# Altium schematic symbol library lib_datalogger.SchLib: 1246 symbols (part 8 of 16) (continued)
## CMP-010-00001-3 (continued)

## CMP-010-000002-1
designator F?, comment FUSE GLASS 3A 250VAC 5X20MM
Manufacturer Part Number: 5MF 3-R; Manufacturer: Bel Fuse Inc.; DC Cold Resistance: 0.03 Ohm; Response Time: Fast; Melting I²t: 13; Voltage Rating - AC: 250V; Approvals: CE, CSA, cULus, PSE; Fuse Type: Cartridge, Glass; Breaking Capacity @ Rated Voltage: 200A; Design Item ID: FUSE GLASS 3A 250VAC 5X20MM; Stock 1: 10338; Pricing 1: 1=0.21, 5=0.204, 10=0.195, 50=0.1736, 100=0.1616, 250=0.14364, 500=0.1197, 1000=0.11372, 5000=0.08978 (USD); RoHS: RoHS Compliant; Color: -; ComponentLink1URL: http://belfuse.com/pdfs/5MF.pdf; Source: mits.SchLib; Voltage Rating - DC: -; Part Status: Active; Category: Circuit Protection; Current Rating: 3A; Size / Dimension: 0.201" Dia x 0.787" L (5.10mm x 20.00mm); Packaging: Bulk; Package / Case: 5mm x 20mm; Operating Temperature: -55°C ~ 125°C; ComponentLink1Description: http://belfuse.com/pdfs/5MF.pdf; Mounting Type: Holder
footprint FUSE_1/4_37.75x6.35mm
footprint FUSE

## CMP-010-00002-3
designator U?, comment MCP9700T-E/TT
Low-Power Linear Active Thermistor(TM) IC, 2.3 to 5.5 V, -40 to 125degC, 3-Pin SOT-23, RoHS, Tape and Reel; Manufacturer: Microchip; Min Supply Voltage (DC): 3V; Max Supply Voltage (DC): 5V; Max Ouput Current: 100A; Sensor Type: Temperature; Interface: Serial; Output Voltage: 500mV; Min Supply Voltage: 2.3V; Output Current: 100µA; Mounting Technology: SM; Datasheet URL: http://ww1.microchip.com/downloads/en/DeviceDoc/21942e.pdf; Package Reference: SOT23-3; Max Supply Voltage: 5V; Package Description: 3-Pin Small Outline Transistor, Body 2.9 x 1.3 mm, Pitch 0.95 mm; Packaging: TapeandReel; Case/Package: TO-236-3; Pins: 3; Max Operating Temperature: 125°C; Min Operating Temperature: -40°C; Package Quantity: 3000; RoHS Compliant: True; Datasheet Version: Rev. E, 04/2009
footprint MCHP-SOT23-3_L (SOT23, 3-Leads, Body 3.05x1.4mm, Pitch 0.95mm, IPC High Density)
footprint MCHP-SOT23-3_M (SOT23, 3-Leads, Body 3.05x1.4mm, Pitch 0.95mm, IPC Low Density)
pins: 1 VDD (power), 2 VOUT (power), 3 GND (power)

## CMP-010-000003-1
designator F?, comment FUSE CERM 10A 250VAC 125VDC 3AB
Manufacturer Part Number: BK/ABC-10-R; Manufacturer: Eaton; Response Time: Fast; Melting I²t: 208.8; Voltage Rating - DC: 125V; Voltage Rating - AC: 250V; DC Cold Resistance: 0.011 Ohm; Fuse Type: Cartridge, Ceramic; Breaking Capacity @ Rated Voltage: 200A AC, 10kA DC; Approvals: CSA, UL; Stock 1: 5849; Package / Case: 3AB, 3AG, 1/4" x 1-1/4"; Category: Circuit Protection; Color: -; Design Item ID: FUSE CERM 10A 250VAC 125VDC 3AB; Mounting Type: Holder; Packaging: Bulk; Source: mits.SchLib; Pricing 1: 1=0.92, 5=0.886, 10=0.829, 50=0.6864, 100=0.572, 250=0.55772, 500=0.4719, 1000=0.4147, 5000=0.3718 (USD); Operating Temperature: -; Size / Dimension: 0.250" Dia x 1.250" L (6.35mm x 31.75mm); Part Status: Active; Current Rating: 10A; ComponentLink1URL: http://www.cooperindustries.com/content/dam/public/bussmann/Electronics/Resources/product-datasheets/Bus_Elx_DS_2000_ABC_Series.pdf; ComponentLink1Description: http://www.cooperindustries.com/content/dam/public/bussmann/Electronics/Resources/product-datasheets/Bus_Elx_DS_2000_ABC_Series.pdf; RoHS: RoHS Compliant
footprint FUSE_1/4_37.75x6.35mm
footprint FUSE_1%2F4_37.75x6.35mm

## CMP-010-00003-3
designator U?, comment MCP9808-E/MS
+/- 0.5 degC Maximum Accuracy Digital Temperature Sensor, 2.7 to 5.5 V, -40 to 125 degC, 8-Pin MSOP, Pb-Free, Tube; Manufacturer: Microchip; Min Supply Voltage (DC): 7V; Min Supply Voltage: 2.7V; Max Supply Voltage (DC): 5V; Output Current: 200µA; Interface: I2C; Case/Package: MSOP; Pins: 8; Max Operating Temperature: 125°C; Datasheet URL: http://ww1.microchip.com/downloads/en/DeviceDoc/25095A.pdf; Packaging: Tray; Package Reference: MSOP-MS8; Package Description: 8-Pin Plastic Micro Small Outline Package, Body 3 x 3 mm, Pitch 0.65 mm; Mounting Technology: SM; RoHS Compliant: True; Package Quantity: 100; Min Operating Temperature: -40°C; Sensor Type: Temperature; Max Supply Voltage: 5V; Datasheet Version: Rev. A, 10/2011
footprint MCHP-MSOP-MS8_L (SOP, 8-Leads, Body 3x3mm, Pitch 0.65mm, IPC High Density)
footprint MCHP-MSOP-MS8_N (SOP, 8-Leads, Body 3x3mm, Pitch 0.65mm, IPC Medium Density)
footprint MCHP-MSOP-MS8_M (SOP, 8-Leads, Body 3x3mm, Pitch 0.65mm, IPC Low Density)
pins: 1 SDA (io) "Serial Data Line", 2 SCL (in) "Serial Clock Line", 3 ALERT (oc) "Temperature Alert Output", 4 GND (power) "Ground", 5 A2 (in) "Slave Address", 6 A1 (in) "Slave Address", 7 A0 (in) "Slave Address", 8 VDD (power) "Power Pin"

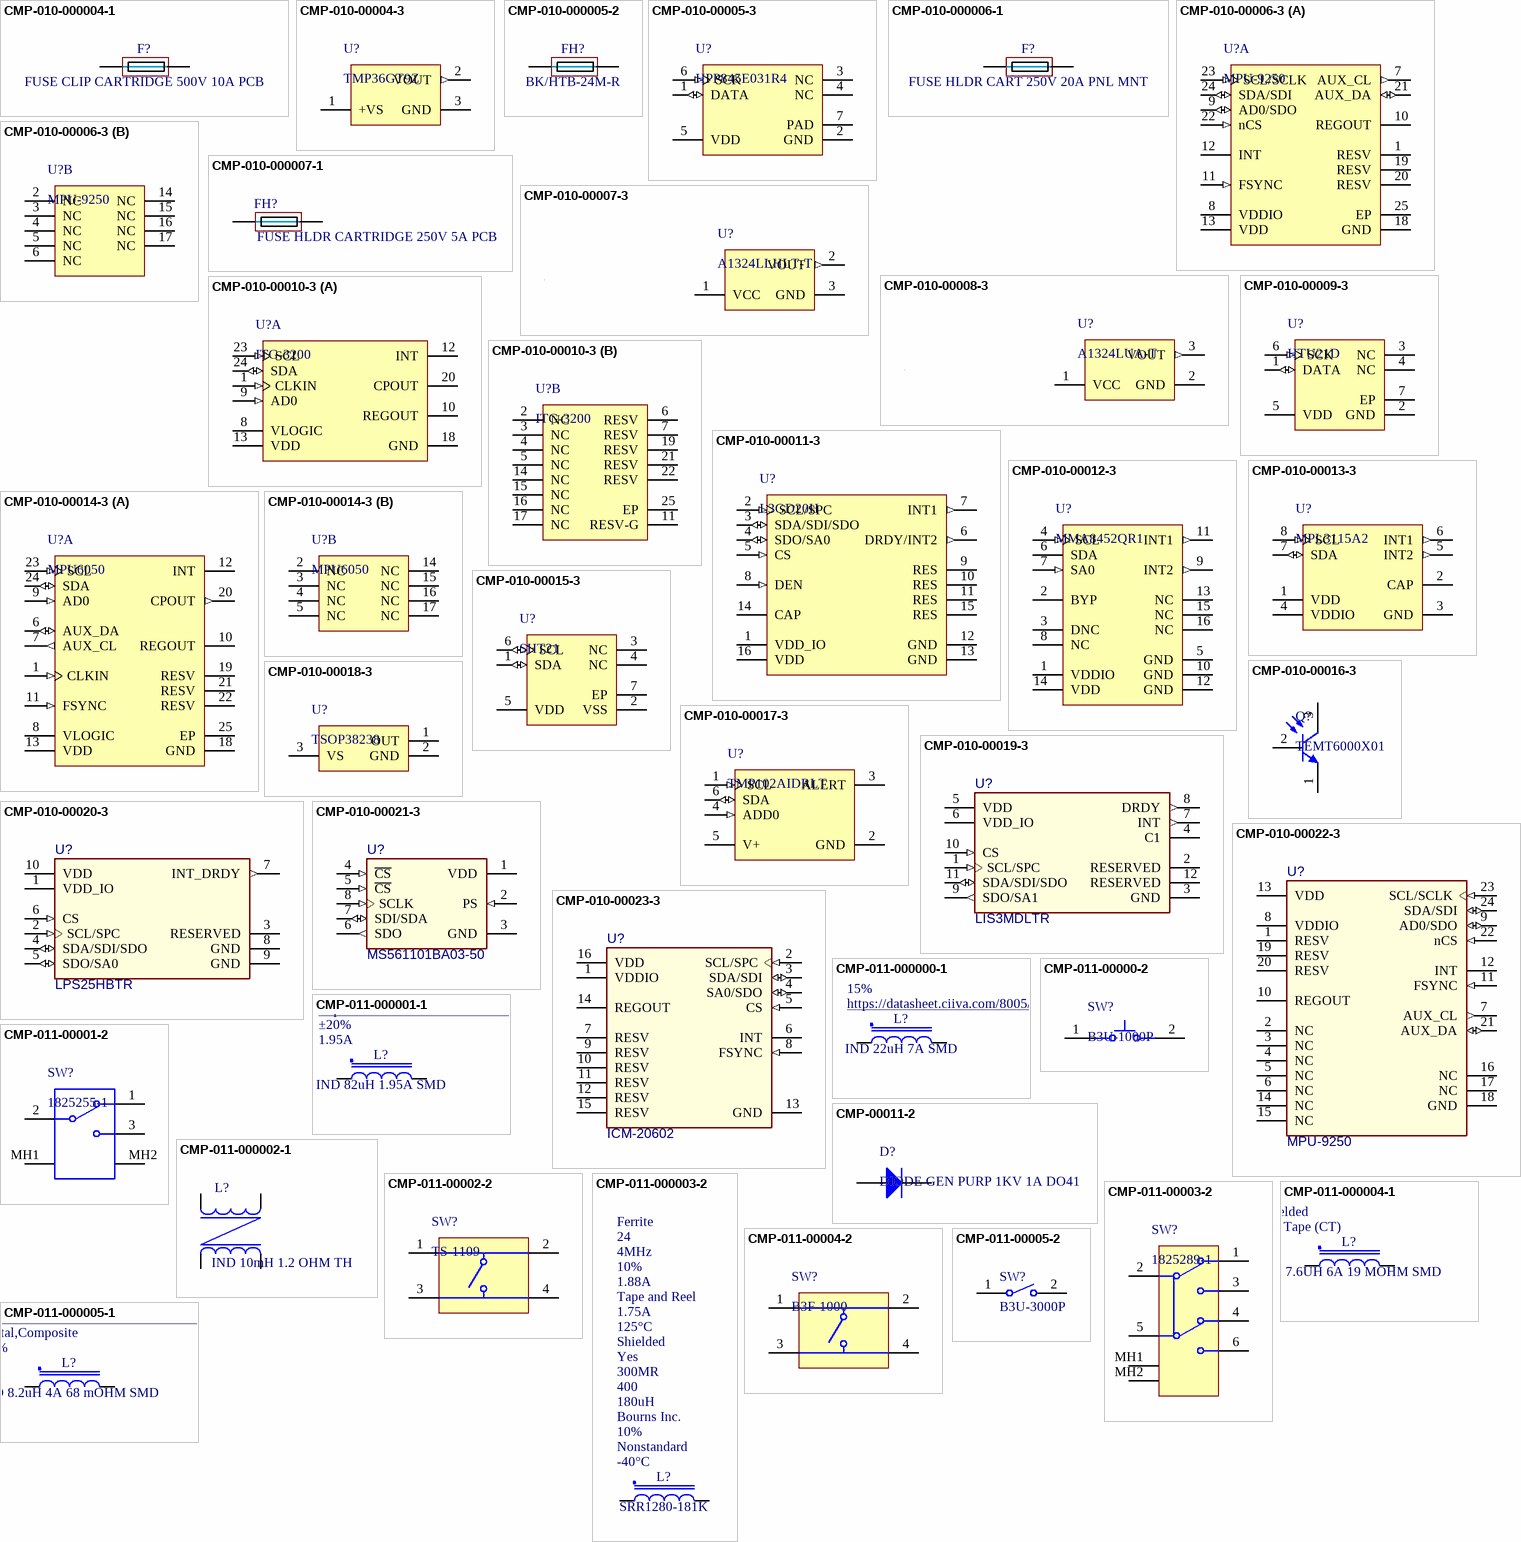
[diagram p22: symbols CMP-010-000004-1 to CMP-011-00005-2]

## CMP-010-000004-1
designator F?, comment FUSE CLIP CARTRIDGE 500V 10A PCB
Manufacturer: Littelfuse Inc.; Manufacturer Part Number: 10207101009; Number of Circuits: 1; For Use With/Related Products: 1/4" Dia; Fuse Size: 1/4" Dia (6.35mm); Contact Material: Brass; Pricing 1: 1=0.24, 10=0.221, 25=0.204, 50=0.1972, 100=0.1836, 250=0.1632, 500=0.136, 1000=0.1292, 2500=0.1156 (USD); RoHS: RoHS Compliant; Stock 1: 48459; Current Rating: 10A; Fuseholder Type: Clip; Contact Finish: Tin; Part Status: Active; Mounting Type: PCB; Orientation: Horizontal; Source: mits.SchLib; ComponentLink1URL: http://www.littelfuse.com/~/media/electronics/datasheets/fuse_clips/littelfuse_fuse_clip_520_521_102071_datasheet.pdf.pdf; Category: Circuit Protection; Termination Style: PC Pin; Design Item ID: FUSE CLIP CARTRIDGE 500V 10A PCB; Voltage: 500V; ComponentLink1Description: http://www.littelfuse.com/~/media/electronics/datasheets/fuse_clips/littelfuse_fuse_clip_520_521_102071_datasheet.pdf.pdf; Fuse Type: Cartridge
footprint FUSE_CLIPS
footprint FUSE_CLIPS
pins: 1, 2

## CMP-010-00004-3
designator U?, comment TMP36GT9Z
Low Voltage Temperature Sensor, 2.7 to 5.5 V, -55 to 150 degC, 3-pin TO-92 (T-3), Tray; Manufacturer: Analog Devices; Nominal Supply Voltage: 3.3V; Interface: Serial; Package Version: 042208-A, 04/2008; Max Supply Voltage: 5.5V; Min Supply Voltage: 2.7V; Datasheet Version: Rev. H, 05/2015; Mounting Technology: TH; RoHS Compliant: True; Package Reference: T-3; Min Operating Temperature: -40°C; Package Description: 3-Pin Plastic Header-Style Package [TO-92]; Sensor Type: Temperature; Packaging: Tray; Max Operating Temperature: 150°C; Package Quantity: 100; Pins: 3; Case/Package: TO-226-3; Datasheet URL: http://www.analog.com/static/imported-files/data_sheets/TMP35_36_37.pdf
footprint ADI-T-3 (TO, 3-Leads, Dia 5.2mm)
pins: 1 +VS (power), 2 VOUT (out), 3 GND (power)

## CMP-010-000005-2
designator FH?, comment BK/HTB-24M-R
Fuse Holder 16A 250V Panel Mount Quick Connect Bulk; Manufacturer: Eaton Bussmann; Fuse Size: 5mm x 20mm; Number of Circuits: 1; Fuse Current: 15A; Body Material: Thermoplastic; Illumination Type: Illuminated; MSRP: 1,313; eVendor#: 283-2712-ND; Obs: Utilizar fusível do tamanho 5x20mm; eVendorPrice: 3,03; eVendor: Digi-Key; Series: HTB; Contact Plating: Tin; Mount: Panel; Length: 41.1mm; Current Rating: 16A; Min Operating Temperature: -55°C; Number of Poles: 1; Termination: Quick Connect; Radiation Hardening: No; Datasheet: http://www.cooperindustries.com/content/dam/public/bussmann/Electronics/Resources/product-datasheets/Bus_Elx_DS_2119_HTB_Series.pdf; Voltage: 250V; Part#: BK/HTB-24M-R; REACH SVHC: No SVHC; Weight: 0.304oz; Material: Thermoplastic; Voltage Rating: 250V; Package Quantity: 100; Number of Pins: 2; Flammability Rating: UL94 V-0; MOQ: 2500; Max Operating Temperature: 85°C; Contact Material: Brass; Packaging: Bulk; Source: mits.SchLib; Color: Black; Lead Free: Lead Free; Voltage Rating (AC): 250V; Design Item ID: FUSE HLDR CART 250V 16A PNL MNT 5X20MM
footprint FUSE_HOLES
footprint FUSE_HOLES
pins: 1, 2

## CMP-010-00005-3
designator U?, comment HPP845E031R4
Digital Relative Humidity Sensor with Temperature Output, 1.5 to 3.6 V, -40 to 125 degC, 6-Pin SON, RoHS, Tape and Reel; Manufacturer: TE Connectivity; Max Supply Voltage: 3.6V; Min Supply Voltage: 1.5V; RoHS Compliant: False; Datasheet Version: Sep-15; Package Description: 6-Pin Small Outline No-lead Package, Body 3 x 3 mm, Pitch 1 mm; Datasheet URL: http://www.te.com/commerce/DocumentDelivery/DDEController?Action=srchrtrv&DocNm=HPC199_6&DocType=Data+Sheet&DocLang=English; Case/Package: SON-6; Package Reference: SON-6; Sensor Type: Humidity; Mounting Technology: SM
footprint TECO-SON-6_V (SON, 6-Leads, Body 3x3mm, Pitch 1mm, Thermal Pad 2.4x1.5mm)
pins: 1 DATA (io) "Data bit-stream", 2 GND (power) "Ground", 3 NC "Must be left unconnected", 4 NC "Must be left unconnected", 5 VDD (power) "Supply Voltage", 6 SCK (in) "Selector for RH or Temp", 7 PAD (power) "Ground or unconnected"

## CMP-010-000006-1
designator F?, comment FUSE HLDR CART 250V 20A PNL MNT
Manufacturer: Cooper Bussmann; Part#: BK/HTB-24I-R; Obs: Utilizar fusível do tamanho 5x20mm; MSRP: 1,27575; eVendor: Digi-Key; eVendorPrice: 2,98; eVendor#: 283-2711-ND; Datasheet: http://www.cooperindustries.com/content/dam/public/bussmann/Electronics/Resources/product-datasheets/Bus_Elx_DS_2119_HTB_Series.pdf; Source: mits.SchLib; MOQ: 2500; Design Item ID: FUSE HLDR CART 250V 20A PNL MNT
footprint FUSE_HOLES
footprint FUSE_HOLES
pins: 1, 2

## CMP-010-00006-3
designator U?, comment MPU-9250
9-axis MotionTracking device, 2.4 to 3,6 V, -40 to 85 degC, 24-Pin QFN, RoHS, Tape and Reel; Manufacturer: InvenSense; Sensor Type: Motion; Max Supply Voltage: 3.6V; Min Supply Voltage: 2.4V; Package Description: 24-Pin Quad Flat No-lead Package, Body 3 x 3 mm, Pitch 0.4 mm; RoHS Compliant: True; Datasheet Version: Rev. 1.0, 01/2014; Pins: 24; Mounting Technology: SM; Datasheet URL: http://datasheet.octopart.com/MPU-9250-InvenSense-datasheet-21859386.pdf; Package Quantity: 5000; Package Reference: QFN-24; Case/Package: Module
footprint INSE-QFN-24-1700X1540TP_L (QFN, 24-Leads, Body 3.1x3.1mm, Pitch 0.40mm, Thermal Pad 1.54x1.70mm, IPC High Density)
footprint INSE-QFN-24-1700X1540TP_N (QFN, 24-Leads, Body 3.1x3.1mm, Pitch 0.40mm, Thermal Pad 1.54x1.70mm, IPC Medium Density)
footprint INSE-QFN-24-1700X1540TP_M (QFN, 24-Leads, Body 3.1x3.1mm, Pitch 0.40mm, Thermal Pad 1.54x1.70mm, IPC Low Density)
part A pins: 1 RESV (power) "Reserved. Connect to VDDIO", 7 AUX_CL (out) "I2C Master serial clock, for connecting to external sensors", 8 VDDIO (power) "Digital I/O supply voltage", 9 AD0/SDO (io) "I2C Slave Address LSB (AD0); SPI serial data output (SDO)", 10 REGOUT "Regulator filter capacitor connection", 11 FSYNC (in) "Frame synchronization digital input. Connect to GND if unused", 12 INT (hiz) "Interrupt digital output (totem pole or open-drain)", 13 VDD (power) "Power supply voltage and Digital I/O supply voltage", 18 GND (power) "Pow er supply ground", 19 RESV "Reserved. Do not connect", 20 RESV (power) "Reserved. Connect to GND", 21 AUX_DA (io) "I2C master serial data, for connecting to external sensors", 22 nCS (in) "Chip select (SPI mode only)", 23 SCL/SCLK (in) "I2C serial clock (SCL); SPI serial clock (SCLK)", 24 SDA/SDI (io) "I2C serial data (SDA); SPI serial data input (SDI)", 25 EP
part B pins: 2 NC "Not internally connected. May be used for PCB trace routing", 3 NC "Not internally connected. May be used for PCB trace routing", 4 NC "Not internally connected. May be used for PCB trace routing", 5 NC "Not internally connected. May be used for PCB trace routing", 6 NC "Not internally connected. May be used for PCB trace routing", 14 NC "Not internally connected. May be used for PCB trace routing", 15 NC "Not internally connected. May be used for PCB trace routing", 16 NC "Not internally connected. May be used for PCB trace routing", 17 NC "Not internally connected. May be used for PCB trace routing"

## CMP-010-000007-1
designator FH?, comment FUSE HLDR CARTRIDGE 250V 5A PCB
Manufacturer Part Number: 4527; Manufacturer: Keystone Electronics; For Use With/Related Products: 1/4" Dia; Fuseholder Type: Holder; Number of Circuits: 1; Fuse Size: 5mm x 20mm; Pricing 1: 1=0.73, 10=0.55, 50=0.44, 100=0.4217, 250=0.38504, 500=0.3667, 1000=0.30784, 2500=0.27504, 5000=0.26586 (USD); ComponentLink1Description: http://www.keyelco.com/product-pdf.cfm?p=324; Category: Circuit Protection; Termination Style: PC Pin; Design Item ID: FUSE HLDR CARTRIDGE 250V 5A PCB; Mounting Type: PCB; Stock 1: 22541; Current Rating: 5A; RoHS: RoHS Compliant; Contact Material: Brass; Source: mits.SchLib; Fuse Type: Cartridge; ComponentLink1URL: http://www.keyelco.com/product-pdf.cfm?p=324; Part Status: Active; Orientation: Horizontal; Contact Finish: Tin; Voltage: 250V
footprint FUSE_HOLDER
footprint FUSE_HOLDER
pins: 1, 2

## CMP-010-00007-3
designator U?, comment A1324LLHLT-T
Low Noise, Linear Hall Effect Sensor IC with Analog Output, 4.5 to 5.5 V, -40 to 150 degC, 3-Pin SOT23, RoHS, Tape and Reel; Manufacturer: Allegro Microsystems; Nominal Supply Voltage: 5V; Max Supply Voltage: 5.5V; Min Supply Voltage: 4.5V; Package Quantity: 3000; Packaging: TapeandReel; Pins: 3; Case/Package: SOT23W-3; Min Operating Temperature: -40°C; Datasheet URL: http://www.allegromicro.com/en/Products/Part_Numbers/1324/1324.pdf; Max Operating Temperature: 150°C; Package Description: 3-Pin Small Outline Transistor, Body 3 x 1.975 mm, Pitch 0.95 mm; Datasheet Version: Rev. 4, 09/2013; Package Reference: SOT23W-3; Mounting Technology: SM; Sensor Type: Hall; RoHS Compliant: True
footprint ALEG-SOT23W-3_V (SOT23, 3-Leads, Body 3.1x2.1mm, Pitch 0.95mm)
pins: 1 VCC (power) "Input power supply; tie to GND with  bypass capacitor", 2 VOUT (out) "Output signal; also used for  programming", 3 GND (power) "Ground"

## CMP-010-00008-3
designator U?, comment A1324LUA-T
Low Noise, Linear Hall Effect Sensor IC with Analog Output, 4.5 to 5.5 V, -40 to 150 degC, 3-Pin SIP (UA), RoHS, Bulk; Manufacturer: Allegro Microsystems; Max Supply Voltage: 5.5V; Output Current: 10mA; Nominal Supply Voltage: 5V; Min Supply Voltage: 4.5V; Package Description: 3-Pin Single In-line Package, Body 4.105 x 1.52 mm, Pitch 1.27 mm; Mounting Technology: TH; Package Reference: UA3; Case/Package: SIP; RoHS Compliant: True; Datasheet Version: Rev. 4, 09/2013; Max Operating Temperature: 150°C; Package Quantity: 4000; Datasheet URL: http://www.allegromicro.com/en/Products/Part_Numbers/1324/1324.pdf; Sensor Type: Hall; Pins: 3; Min Operating Temperature: -40°C; Packaging: Bulk
footprint ALEG-UA-3 (SIP, 3-Leads, Body 4.2x1.6mm, Pitch 1.27 mm)
pins: 1 VCC (power) "Input power supply; tie to GND with  bypass capacitor", 2 GND (power) "Ground", 3 VOUT (out) "Output signal; also used for  programming"

## CMP-010-00009-3
designator U?, comment HTU21D
Digital Relative Humidity Sensor with Temperature Output, 1.5 to 3.6 V, -40 to 125 degC, 6-Pin SON, RoHS, Tape and Reel; Manufacturer: Measurement Specialties; Min Supply Voltage: 1.5V; Interface: Serial; Max Supply Voltage: 3.6V; Nominal Supply Voltage: 3V; Max Operating Temperature: 125°C; Case/Package: DFN; RoHS Compliant: True; Pins: 6; Sensor Type: Humidity; Package Description: 6-Pin Small Outline No-Lead, Body 3 x 3 mm, Pitch 1 mm, Thermal Pad 2.4 x 1.5 mm; Min Operating Temperature: -40°C; Mounting Technology: SM; Datasheet URL: https://datasheet.ciiva.com/28624/1792510-28624306.pdf; Package Reference: SON-6; Packaging: TapeandReel; Datasheet Version: Rev. 2, 07/2013
footprint MEAS-SON-6_V (SON, 6-Leads, Body 3x3mm, Pitch 1mm, Thermal Pad 2.4x1.5mm)
pins: 1 DATA (io) "Data bit-stream", 2 GND (power) "Ground", 3 NC "Must be left unconnected", 4 NC "Must be left unconnected", 5 VDD (power) "Supply Voltage", 6 SCK (in) "Selector for RH or Temp", 7 EP (power) "Ground or unconnected"

## CMP-010-00010-3
designator U?, comment ITG-3200
Single-Chip, Digital-Output, MEMS Gyroscope, 2.1 to 3.6 V, -40 to 105 degC, 24 -Pin QFN, RoHS, Tape and Reel; Manufacturer: InvenSense; Interface: Serial; Min Supply Voltage: 2.1V; Max Supply Voltage: 3.6V; Min Operating Temperature: -40°C; Datasheet URL: http://www.farnell.com/datasheets/887152.pdf; Datasheet Version: Rev. 1.4, 03/2010; Packaging: CutTape; Pins: 24; Package Description: 24-Pin Quad Flat No-lead Package, Body 4.00 x 4.00 mm, Pitch 0.50 mm, Thermal Pad 3.00 x 2.80 mm; RoHS Compliant: True; Max Operating Temperature: 85°C; Package Reference: QFN-24_A; Case/Package: QFN; Mounting Technology: SM
footprint INSE-QFN-24_A_L (QFN, 24-Leads, Body 4.1x4.1mm, Pitch 0.50mm, Thermal Pad 3.00x2.80mm, IPC High Density)
footprint INSE-QFN-24_A_N (QFN, 24-Leads, Body 4.1x4.1mm, Pitch 0.50mm, Thermal Pad 3.00x2.80mm, IPC Medium Density)
footprint INSE-QFN-24_A_M (QFN, 24-Leads, Body 4.1x4.1mm, Pitch 0.50mm, Thermal Pad 3.00x2.80mm, IPC Low Density)
part A pins: 1 CLKIN (in) "Optional external reference clock input. Connect to GND if unused.", 8 VLOGIC (power) "Digital IO supply voltage. VLOGIC must be =< VDD at all times.", 9 AD0 (in) "I2C Slave Address LSB", 10 REGOUT "Regulator filter capacitor connection", 12 INT (oc) "Interrupt digital output (totem pole or open-drain)", 13 VDD (power) "Power supply voltage", 18 GND (power) "Power supply ground", 20 CPOUT "Charge pump capacitor connection", 23 SCL (in) "I2C serial clock", 24 SDA (io) "I2C serial data"
part B pins: 2 NC "Not internally connected. May be used for PCB trace routing.", 3 NC "Not internally connected. May be used for PCB trace routing.", 4 NC "Not internally connected. May be used for PCB trace routing.", 5 NC "Not internally connected. May be used for PCB trace routing.", 6 RESV "Reserved. Do not connect.", 7 RESV "Reserved. Do not connect.", 11 RESV-G "Reserved - Connect to ground", 14 NC "Not internally connected. May be used for PCB trace routing.", 15 NC "Not internally connected. May be used for PCB trace routing.", 16 NC "Not internally connected. May be used for PCB trace routing.", 17 NC "Not internally connected. May be used for PCB trace routing.", 19 RESV "Reserved. Do not connect.", 21 RESV "Reserved. Do not connect.", 22 RESV "Reserved. Do not connect.", 25 EP

## CMP-010-00011-3
designator U?, comment L3GD20H
MEMS Motion Sensor: Three-Axis Digital Output Gyroscope, 2.2 to 3.6 V, -40 to 85 degC, 16-Pin LGA, RoHS, Tray; Manufacturer: STMicroelectronics; Max Supply Voltage: 3.6V; Min Supply Voltage: 2.2V; Pins: 16; Datasheet Version: Rev. 2, 03/2013; Package Description: 16-Pin Land Grid Array Package, Body 3 x 3 mm, Pitch 0.5 mm; RoHS Compliant: True; Case/Package: LGA; Packaging: CutTape; Datasheet URL: http://www.st.com/content/ccc/resource/technical/document/datasheet/35/b1/e0/39/71/57/43/01/DM00060659.pdf/files/DM00060659.pdf/jcr:content/translations/en.DM00060659.pdf; Sensor Type: Motion; Mounting Technology: SM; Package Reference: LGA-16
footprint STM-LGA-16_L (LGA, 16-Leads, Body 3.15x3.15mm, Pitch 0.5mm, IPC High Density)
footprint STM-LGA-16_N (LGA, 16-Leads, Body 3.15x3.15mm, Pitch 0.5mm, IPC Medium Density)
footprint STM-LGA-16_M (LGA, 16-Leads, Body 3.15x3.15mm, Pitch 0.5mm, IPC Low Density)
pins: 1 VDD_IO (power) "Power supply for I/O pins", 2 SCL/SPC (in), 3 SDA/SDI/SDO (io), 4 SDO/SA0 (io), 5 CS (in) "I2C/SPI mode selection (1: SPI idle mode / I2C communication enabled; 0: SPI communication mode / I2C disabled)", 6 DRDY/INT2 (out), 7 INT1 (out) "Programmable interrupt", 8 DEN (in) "Gyroscope data enable", 9 RES "Connect to GND", 10 RES "Connect to GND", 11 RES "Connect to GND or VDD", 12 GND (power) "0 V supply", 13 GND (power) "0 V supply", 14 CAP "Connect to GND with ceramic capacitor", 15 RES "Connect to GND or VDD", 16 VDD (power) "Power supply"

## CMP-010-00012-3
designator U?, comment MMA8452QR1
3-Axis, 12-Bit / 8-Bit Digital Acceleromete, 1.95 to 3.6 V, -40 to 85 degC, 16-Pin QFN, RoHS, Tape and Reel; Manufacturer: Freescale; Min Supply Voltage: 1.95V; Sensor Type: Motion; Interface: I2C; Max Supply Voltage: 3.6V; Nominal Supply Voltage: 2.5V; Datasheet Version: Rev. 10, 04/2016; Max Operating Temperature: 85°C; Package Quantity: 1000; Package Reference: QFN-16; Datasheet URL: http://cache.nxp.com/files/sensors/doc/data_sheet/MMA8452Q.pdf; Packaging: TapeandReel; Case/Package: QFN; Mounting Technology: SM; Pins: 16; RoHS Compliant: True; Min Operating Temperature: -40°C; Package Description: 16-Pin Quad Flat No-lead Package, Body 3 x 3 mm , Pitch 0.5 mm
footprint FREE-QFN-16_V (QFN, 16-Leads, Body 3x3mm, Pitch 0.5mm)
pins: 1 VDDIO (power) "Internal power supply (1.62 V to 3.6 V)", 2 BYP "Bypass capacitor (0.1 uF)", 3 DNC "Do not connect to anything, leave pin isolated and floating.", 4 SCL (in) "I2C serial clock, open drain", 5 GND (power) "Connect to ground", 6 SDA "I2C serial data", 7 SA0 (in) "I2C least significant bit of the device I2C address, I2C 7-bit address = 0x1C (SA0 = 0), 0x1D (SA0 = 1).", 8 NC "Internally not connected", 9 INT2 (out) "Inertial interrupt 2, output pin", 10 GND (power) "Connect to ground", 11 INT1 (out) "Inertial interrupt 1, output pin", 12 GND (power) "Connect to ground", 13 NC "Internally not connected", 14 VDD (power) "Power supply (1.95 V to 3.6 V)", 15 NC "Internally not connected", 16 NC "Internally not connected (can be GND or VDD)"

## CMP-010-00013-3
designator U?, comment MPL3115A2
I2C Precision Pressure Sensor with Altimetry, 1.95 to 3.6 V, -40 to 85 degC, 8-Pin LGA, RoHS, Tray; Manufacturer: Freescale Semiconductor; Max Supply Voltage: 3.6V; Nominal Supply Current: 2µA; Nominal Supply Voltage: 2.5V; Output Voltage: 3.9V; Min Supply Voltage: 1.95V; Datasheet Version: Rev. 4.0, 09/2015; Pins: 8; Package Reference: 2153-01; Max Operating Temperature: 85°C; Case/Package: LGA; Min Operating Temperature: -40°C; RoHS Compliant: True; Sensor Type: Pressure; Package Quantity: 490; Datasheet URL: http://cache.freescale.com/files/sensors/doc/data_sheet/MPL3115A2.pdf; Packaging: Tray
footprint FRES-2153-01_V (LGA, 8-Leads, Body 5x3mm, Pitch 1.25mm)
pins: 1 VDD (power) "VDD Power Supply Connection (1.95-3.6 V)", 2 CAP "External Capacitor", 3 GND (power) "Ground", 4 VDDIO (power) "Digital Interface Power Supply (1.62-3.6 V)", 5 INT2 (out) "Pressure Interrupt 2", 6 INT1 (out) "Pressure Interrupt 1", 7 SDA (io) "I2C Serial Data", 8 SCL (in) "I2C Serial Data"

## CMP-010-00014-3
designator U?, comment MPU6050
3-Axis Gyroscope, 3-Axis Accelerometer, 2.375 to 3.46 V, -40 to 105 degC, 24-Pin QFN, RoHS, Tape and Reel; Manufacturer: InvenSense; Max Supply Voltage: 3.6V; Min Supply Voltage: 2.5V; Sensor Type: Motion; Interface: I2C; Min Operating Temperature: -40°C; Case/Package: QFN; Package Quantity: 5000; Pins: 24; RoHS Compliant: True; Packaging: CutTape; Datasheet URL: https://datasheet.ciiva.com/1513/1788002-1513632.pdf; Package Reference: QFN-24; Datasheet Version: Rev. 3.4, 08/2013; Package Description: 24-Pin Quad Flat No-lead Package, Body 4 x 4 mm, Pitch 0.5 mm; Max Operating Temperature: 85°C; Mounting Technology: SM
footprint INSE-QFN-24_V (QFN, 24-Leads, Body 4.00x4.00mm, Pitch 0.50mm, Thermal Pad 2.7x2.6mm)
part A pins: 1 CLKIN (in) "Optional external reference clock input. Connect to GND if unused.", 6 AUX_DA (io) "I2C master serial data, for connecting to external sensors", 7 AUX_CL (out) "I2C Master serial clock, for connecting to external sensors", 8 VLOGIC (power) "Digital I/O supply voltage", 9 AD0 (in) "I2C Slave Address LSB (AD0)", 10 REGOUT "Regulator filter capacitor connection", 11 FSYNC (in) "Frame synchronization digital input. Connect to GND if unused.", 12 INT (oc) "Interrupt digital output (totem pole or open-drain)", 13 VDD (power) "Power supply voltage and Digital I/O supply voltage", 18 GND (power) "Power supply ground", 19 RESV "Reserved. Do not connect.", 20 CPOUT (out) "Charge pump capacitor connection", 21 RESV "Reserved. Do not connect.", 22 RESV "Reserved. Do not connect.", 23 SCL (in) "I2C serial clock (SCL)", 24 SDA (io) "I2C serial data (SDA)", 25 EP
part B pins: 2 NC "Not internally connected. May be used for PCB trace routing.", 3 NC "Not internally connected. May be used for PCB trace routing.", 4 NC "Not internally connected. May be used for PCB trace routing.", 5 NC "Not internally connected. May be used for PCB trace routing.", 14 NC "Not internally connected. May be used for PCB trace routing.", 15 NC "Not internally connected. May be used for PCB trace routing.", 16 NC "Not internally connected. May be used for PCB trace routing.", 17 NC "Not internally connected. May be used for PCB trace routing."

## CMP-010-00015-3
designator U?, comment SHT21
Humidity and Temperature Sensor, 2.1 to 3.6 V, -40 to 125 degC, 6-Pin DFN, RoHS, Tape and Reel; Manufacturer: Sensirion; Min Supply Voltage: 2.1V; Nominal Supply Voltage: 3V; Max Supply Voltage: 3.6V; Interface: Serial; Mounting Technology: SM; Datasheet URL: https://www.sensirion.com/fileadmin/user_upload/customers/sensirion/Dokumente/2_Humidity_Sensors/Sensirion_Humidity_Sensors_SHT21_Datasheet_V4.pdf; Datasheet Version: Rev. 4, 05/2014; Pins: 6; RoHS Compliant: True; Packaging: CutTape; Max Operating Temperature: 125°C; Min Operating Temperature: -40°C; Case/Package: DFN; Sensor Type: HumidityandTemperature; Package Description: 6-Pin Smal Outline Non-lead, Body 3 x 3 mm, Pitch 1 mm
footprint SENS-SON-6_V (SON, 6-Leads, Body 3x3mm, Pitch 1mm, Thermal Pad 2.4x1.5mm)
pins: 1 SDA (io) "Serial Data, bidirectional", 2 VSS (power) "Ground", 3 NC "Not Connected", 4 NC "Not Connected", 5 VDD (power) "Supply Voltage", 6 SCL (io) "Serial Clock, bidirectional", 7 EP (power) "The die pad (center pad) is internally connected to VSS"

## CMP-010-00016-3
designator Q?, comment TEMT6000X01
Ambient Light Sensor, 100 mW, -40 to 100 degC, 3-Pin SMD, RoHS, Tape and Reel; Manufacturer: Vishay Siliconix; Datasheet Version: Rev. 1.9, 08/2011; Package Reference: 1206; RoHS Compliant: Unknown; Case/Package: 1206; Datasheet URL: http://www.vishay.com/docs/81579/temt6000.pdf; Package Description: 3-Pin Surface Mount Device, Body 4 x 2 mm; Sensor Type: Light; Mounting Technology: SM
footprint VSIL-TEMT6000X01_V (SMD, 3-Leads, Body 4x2mm)
pins: 1 E, 2 B, 3 C

## CMP-010-00017-3
designator U?, comment TMP102AIDRLT
Low Power Digital Temperature Sensor with SMBus and Two-Wire Serial Interface, 1.4 to 3.6 V, -40 to 125 degC, 6-Pin SOT (DRL), Green (RoHS & no Sb/Br), Tape and Reel; Manufacturer: Texas Instruments; Package Version: 4205622-3/D, 08/2207; Output Current: 3mA; Max Supply Voltage: 3.3V; Min Supply Voltage (DC): 4V; Interface: I2C; Min Supply Voltage: 1.4V; Max Supply Voltage (DC): 6V; Datasheet URL: http://www.ti.com/lit/ds/symlink/tmp102.pdf; RoHS Compliant: True; Sensor Type: Temperature; Mounting Technology: SM; Package Description: 6-Pin Plastic Small Outline, Body 1.6 x 1.2 mm, Pitch 0.5 mm; Datasheet Version: SBOS397F, 12/2015; Package Quantity: 1; Min Operating Temperature: -55°C; Pins: 6; Max Operating Temperature: 150°C; Package Reference: DRL0006A; Case/Package: SOT-553-6; Packaging: CutTape
footprint DRL0006A_N (SOT23, 6-Leads, Body 1.7x1.3mm, Pitch 0.5mm, IPC Medium Density)
footprint DRL0006A_M (SOT23, 6-Leads, Body 1.7x1.3mm, Pitch 0.5mm, IPC Low Density)
footprint DRL0006A_L (SOT23, 6-Leads, Body 1.7x1.3mm, Pitch 0.5mm, IPC High Density)
pins: 1 SCL (in) "Serial clock. Open-drain output; requires a pullup resistor.", 2 GND (power) "Ground", 3 ALERT (oc) "Overtemperature alert. Open-drain output; requires a pullup resistor.", 4 ADD0 (in) "Address select. Connect to GND or V+", 5 V+ (power) "Supply voltage, 1.4 V to 3.6 V", 6 SDA (io) "Serial data. Open-drain output; requires a pullup resistor."

## CMP-010-00018-3
designator U?, comment TSOP38238
IR Receiver Modules for Remote Control System, 2.5 to 5.5 V, -25 to 85 degC, 3-Pin THD, RoHS, Bulk; Manufacturer: Vishay Semiconductor; Nominal Supply Current: 3mA; Max Supply Voltage: 5.5V; Sensor Type: Optical; Min Supply Voltage: 2.5V; Output Current: 5mA; Datasheet Version: Rev. 1.5, 07/2016; Package Reference: TSOP38238; Mounting Technology: TH; Package Description: 3-Pin Through Hole Device, Body 5.00 x 4.80 mm, Pitch 2.54 mm; Max Operating Temperature: 85°C; Package Quantity: 1500; RoHS Compliant: True; Case/Package: Axial; Min Operating Temperature: -25°C; Pins: 3; Packaging: Bulk; Datasheet URL: http://www.vishay.com/docs/82491/tsop382.pdf
footprint VISH-TSOP38238 (TH, 3-Leads, Body 5.00x4.80mm, Pitch 2.54mm)
pins: 1 OUT (power), 2 GND (power), 3 VS (power)

## CMP-010-00019-3
designator U?, comment LIS3MDLTR
Digital Output Magnetic Sensor, 1.9 to 3.6 V, -40 to 85 degC, 12-Pin LGA, RoHS, Tape and Reel; Max Supply Voltage: 3.6V; Min Supply Voltage: 1.9V; Sensor Type: Magnetometer; Min Operating Temperature: -40°C; RoHS Compliant: Yes; Mounting Technology: SMT; Case/Package: LGA-12; Max Operating Temperature: 85°C; Pins: 12
footprint STM-LGA-12 (LGA, 12-Leads, Body 2x2mm, Pitch 0.5mm)
footprint STM-LGA-12 (LGA, 12-Leads, Body 2x2mm, Pitch 0.5mm)
pins: 1 SCL/SPC (in), 2 RESERVED "Connect to GND", 3 GND (power) "Connect to GND", 4 C1 "Capacitor connection (C1=100 nF)", 5 VDD (power) "Power supply", 6 VDD_IO (power) "Power supply for I/O pins", 7 INT (out) "Interrupt", 8 DRDY (out) "Data Ready", 9 SDO/SA1 (out), 10 CS (in) "SPI enable,I2C/SPI mode selection,(1: SPI idle mode / I2C communication enabled;0: SPI communication mode / I2C disabled)", 11 SDA/SDI/SDO (io), 12 RESERVED "Connect to GND"

## CMP-010-00020-3
designator U?, comment LPS25HBTR
MEMS Pressure Sensor, 1.7 to 3.6 V, -30 to 105 degC, 10-Pin LGA, RoHS, Tray; Min Supply Voltage: 1.7V; Sensor Type: Barometer; Max Supply Voltage: 3.6V; Mounting Technology: SMT; Case/Package: LGA-10; Max Operating Temperature: 105°C; RoHS Compliant: Yes; Pins: 10; Min Operating Temperature: -30°C
footprint STM-LGA-10 (LGA, 10-Leads, Body 2.5x2.5mm, Pitch 0.6mm)
footprint STM-LGA-10 (LGA, 10-Leads, Body 2.5x2.5mm, Pitch 0.6mm)
pins: 1 VDD_IO (power) "Power supply for I/O pins", 2 SCL/SPC (in), 3 RESERVED "Connect to GND", 4 SDA/SDI/SDO (io), 5 SDO/SA0 (io), 6 CS (in), 7 INT_DRDY (out) "Interrupt or Data Ready", 8 GND (power) "0 V supply", 9 GND (power) "0 V supply", 10 VDD (power) "Power supply"

## CMP-010-00021-3
designator U?, comment MS561101BA03-50
Barometric Pressure Sensor, 1.8 to 3.6 V, -40 to 85 degC, 8-Pin SMD, RoHS, Tape and Reel; Min Supply Voltage: 1.8V; Max Supply Voltage: 3.6V; Sensor Type: Barometer; Pins: 8; RoHS Compliant: Yes; Mounting Technology: SMT; Case/Package: LGA-8; Min Operating Temperature: -40°C; Max Operating Temperature: 85°C
footprint TECO-MS561101BA03_V (SMD, 8-Leads, Body 3x5mm, Pitch 1.25mm)
footprint TECO-MS561101BA03_V (SMD, 8-Leads, Body 3x5mm, Pitch 1.25mm)
pins: 1 VDD (power) "Positive supply voltage", 2 PS (in) "Protocol select. PS high (VDD) ---> I2C. PS low (GND) ---> SPI", 3 GND (power) "Ground", 4 ~{CS} (in) "Chip select (active low), internal connection", 5 ~{CS} (in) "Chip select (active low), internal connection", 6 SDO (out) "Serial data output", 7 SDI/SDA (io) "Serial data input / I2C data IO", 8 SCLK (in) "Serial data clock"

## CMP-010-00022-3
designator U?, comment MPU-9250
9-axis MotionTracking device, 2.4 to 3,6 V, -40 to 85 degC, 24-Pin QFN, RoHS, Tape and Reel; Min Supply Voltage: 2.4V; Max Supply Voltage: 3.6V; Sensor Type: Accelerometer,Gyroscope,Magnetometer; Pins: 24; Max Operating Temperature: 85°C; Min Operating Temperature: -40°C; Mounting Technology: SMT; Case/Package: QFN
footprint INSE-QFN-24-1700X1540TP_N (QFN, 24-Leads, Body 3.1x3.1mm, Pitch 0.40mm, Thermal Pad 1.54x1.70mm, IPC Medium Density)
footprint INSE-QFN-24-1700X1540TP_N (QFN, 24-Leads, Body 3.1x3.1mm, Pitch 0.40mm, Thermal Pad 1.54x1.70mm, IPC Medium Density)
pins: 1 RESV (power) "Reserved. Connect to VDDIO", 2 NC "Not internally connected. May be used for PCB trace routing", 3 NC "Not internally connected. May be used for PCB trace routing", 4 NC "Not internally connected. May be used for PCB trace routing", 5 NC "Not internally connected. May be used for PCB trace routing", 6 NC "Not internally connected. May be used for PCB trace routing", 7 AUX_CL (out) "I2C Master serial clock, for connecting to external sensors", 8 VDDIO (power) "Digital I/O supply voltage", 9 AD0/SDO (io) "I2C Slave Address LSB (AD0); SPI serial data output (SDO)", 10 REGOUT "Regulator filter capacitor connection", 11 FSYNC (in) "Frame synchronization digital input. Connect to GND if unused", 12 INT (hiz) "Interrupt digital output (totem pole or open-drain)", 13 VDD (power) "Power supply voltage and Digital I/O supply voltage", 14 NC "Not internally connected. May be used for PCB trace routing", 15 NC "Not internally connected. May be used for PCB trace routing", 16 NC "Not internally connected. May be used for PCB trace routing", 17 NC "Not internally connected. May be used for PCB trace routing", 18 GND (power) "Pow er supply ground", 19 RESV "Reserved. Do not connect", 20 RESV (power) "Reserved. Connect to GND", 21 AUX_DA (io) "I2C master serial data, for connecting to external sensors", 22 nCS (in) "Chip select (SPI mode only)", 23 SCL/SCLK (in) "I2C serial clock (SCL); SPI serial clock (SCLK)", 24 SDA/SDI (io) "I2C serial data (SDA); SPI serial data input (SDI)"

## CMP-010-00023-3
designator U?, comment ICM-20602
High Performance 6-Axis MEMS MotionTracking(TM) Device, 1.71 to 3.45 V, -40 to 85 degC, 16-Pin LGA, RoHS; Max Supply Voltage: 3.45V; Sensor Type: 6 Axis,Accelerometer,Gyroscope,Temperature; Min Supply Voltage: 1.71V; Mounting Technology: SMT; Max Operating Temperature: 85°C; Min Operating Temperature: -40°C; Pins: 16; Case/Package: LGA-16; RoHS Compliant: Yes
footprint INSE-I62-16 (LGA, 16-Leads, Body 3x3mm, Pitch 0.5mm)
footprint INSE-I62-16 (LGA, 16-Leads, Body 3x3mm, Pitch 0.5mm)
pins: 1 VDDIO (power) "Digital I/O supply voltage", 2 SCL/SPC (in) "I2C serial clock (SCL); SPI serial clock (SPC)", 3 SDA/SDI (io) "I2C serial data (SDA); SPI serial data input (SDI)", 4 SA0/SDO (io) "I2C slave address LSB (SA0); SPI serial data output (SDO)", 5 CS (in) "Chip select (0 = SPI mode; 1 = I2C mode)", 6 INT (oc) "Interrupt digital output (totem pole or open-drain)", 7 RESV "Reserved. Do not connect.", 8 FSYNC (in) "Synchronization digital input (optional). Connect to GND if unused.", 9 RESV "Reserved. Connect to GND.", 10 RESV "Reserved. Connect to GND.", 11 RESV "Reserved. Connect to GND.", 12 RESV "Reserved. Connect to GND.", 13 GND (power) "Connect to GND", 14 REGOUT "Regulator filter capacitor connection", 15 RESV "Reserved. Connect to GND.", 16 VDD (power) "Power Supply"

## CMP-011-000000-1
designator L?, comment IND 22uH 7A SMD  Inductance Tolerance: 15%  Saturation Current: 8.7A  Packaging: Tape and Reel  Core Material: Ferrite  Manufacturer: Eaton Cooper  Case/Package: SMD/SMT  Current Rating: 6.3A  Min Operating Temperature: -40°C  Package Quantity: 450  Shielding: Unshielded  Inductance: 22uH  Max Operating Temperature: 155°C
INDUCTOR, SHIELDED, 22UH, 8.7A, SMD; Product Range:COILTRONICS - HC9 Series; Inductance:22µH; Inductance Tolerance:± 15%; Inductor Construction:Shielded; DC Resistance Max:0.0257ohm; RMS Current (Irms):6.3A; Packaging:Cut Tape; Manufacturer Part Number: HC9-220-R; Test Frequency: 100kHz; DC Resistance (DCR): 25.7mR; REACH SVHC: No SVHC; RMS Current (Irms): 6.3A; ComponentLink1Description: https://datasheet.ciiva.com/8005/175565-8005032.pdf?src-supplier=Element14; ComponentLink4Description: https://datasheet.ciiva.com/4958/bus-elx-ds-4312-hc9-series-4958407.pdf?src-supplier=Mouser; Radiation Hardening: No; Source: mits.SchLib; ComponentLink2URL: https://datasheet.ciiva.com/8005/175565-8005261.pdf?src-supplier=Element14; Number of Pins: 2; Stock 1: 9661; Max DC Current: 6.3A; Category: Fixed Inductors; Height: 7.5mm; ComponentLink6Description: https://datasheet.ciiva.com/16379/bus-elx-ds-4312-hc9-series-16379722.pdf?src-supplier=Future+Electronics; Tolerance: 15%; Mount: Surface Mount; Military Standard: Not; ComponentLink2Description: https://datasheet.ciiva.com/8005/175565-8005261.pdf?src-supplier=Element14; RoHS: Yes; Lead Free: Lead Free; Pricing 1: 1=3,27000, 10=2,99800, 100=1,96240 (USD); ComponentLink5Description: https://datasheet.ciiva.com/46385/175565-46385337.pdf?src-supplier=Element14; Termination: SMD/SMT; Design Item ID: IND 22uH 7A SMD; ComponentLink1URL: https://datasheet.ciiva.com/8005/175565-8005032.pdf?src-supplier=Element14; ComponentLink3URL: https://datasheet.ciiva.com/30119/263f48f6d8e14249bee9e64b52387e1f-30119805.pdf?src-supplier=Onlinecomponents.com; Weight: 0.256oz; Depth: 13.1mm; ComponentLink4URL: https://datasheet.ciiva.com/4958/bus-elx-ds-4312-hc9-series-4958407.pdf?src-supplier=Mouser; ComponentLink6URL: https://datasheet.ciiva.com/16379/bus-elx-ds-4312-hc9-series-16379722.pdf?src-supplier=Future+Electronics; ComponentLink3Description: https://datasheet.ciiva.com/30119/263f48f6d8e14249bee9e64b52387e1f-30119805.pdf?src-supplier=Onlinecomponents.com; ComponentLink5URL: https://datasheet.ciiva.com/46385/175565-46385337.pdf?src-supplier=Element14; ComponentLink7URL: https://datasheet.ciiva.com/22710/175565-22710447.pdf?src-supplier=Element14; Length: 13.8mm; ComponentLink7Description: https://datasheet.ciiva.com/22710/175565-22710447.pdf?src-supplier=Element14; Width: 13.1mm
footprint INDUCTOR 1365
pins: 1, 2

## CMP-011-00000-2
designator SW?, comment B3U-1000P
Tactile Switch, SPST-NO, 0.05 A, 12 V, -25 to 70 degC, 2-Pin SMD, RoHS, Tape and Reel; Manufacturer: Omron Electronic Components; IP Rating: IP40; Current Rating: 50mA; Max Contact Resistance: 100mohm; Operating Force: 153gf; Throw Configuration: SPST; Resistance: 0.1Ohm; Max Voltage Rating (DC): 12V; Contact Material: Silver; Max Current Rating: 50mA; Datasheet URL: http://www.omron.com/ecb/products/pdf/en-b3u.pdf; Mounting Technology: SM; Case/Package: B3U-1000; Packaging: TapeandReel; Package Reference: B3U-1000; Manufacturer URL: http://www.omron.com/; Datasheet Version: Jan-15; RoHS Compliant: True; Max Operating Temperature: 70°C; Contact Current Rating: 50mA; Package Quantity: 3500; Package Description: 2-Pin Surface Mount Device, Body 3 x 2.5 mm; Voltage Rating (DC): 12V; Min Operating Temperature: -25°C; Voltage Rating: 12V
footprint OMRON-B3U-1000_V (SMD, 2-Leads, Body 3x2.5mm)
pins: 1, 2

## CMP-011-000001-1
designator L?, comment IND 82uH 1.95A SMD  Current Rating: 1.95A  Tolerance: ±20%  Shielding: Shielded  Packaging: Cut Tape (CT)  Manufacturer: Bourns Inc.  Inductance: 82µH
FIXED IND 82UH 1.95A 145 MOHM; Manufacturer Part Number: SRR1260-820M; Type: Wirewound; Q @ Freq: 25 @ 2.52MHz; Current - Saturation: 1.9A; DC Resistance (DCR): 145 mOhm Max; Material - Core: Ferrite; Frequency - Self Resonant: 6.85MHz; Frequency - Test: 100kHz; ComponentLink1Description: http://www.bourns.com/docs/Product-Datasheets/SRR1260.pdf; Stock 1: 3178; RoHS: RoHS Compliant; Design Item ID: IND 82uH 1.95A SMD; Source: mits.SchLib; Size / Dimension: 0.492" L x 0.492" W (12.50mm x 12.50mm); Pricing 1: 1=0.99, 10=0.93, 25=0.868, 50=0.744, 100=0.7068, 250=0.6448 (USD); Mounting Type: Surface Mount; Ratings: -; Package / Case: Nonstandard; ComponentLink1URL: http://www.bourns.com/docs/Product-Datasheets/SRR1260.pdf; Operating Temperature: -40°C ~ 125°C; Category: Inductors, Coils, Chokes; Height - Seated (Max): 0.256" (6.50mm)
footprint INDUCTOR_1210
pins: 1, 2

## CMP-011-00001-2
designator SW?, comment 1825255-1
Slide Switch, SPDT, 0.3A, 125 V, -20 to 85 degC, 5-Pin THD, RoHS, Tray; Manufacturer: TE Connectivity; Current Rating: 300mA; Voltage Rating (AC): 125V; Max Contact Resistance: 30mohm; Operating Force: 600gf; Manufacturer URL: http://www.te.com/; Max Current Rating: 300mA; Contact Plating: Silver; Contact Material: Copper; Datasheet URL: http://www.te.com/commerce/DocumentDelivery/DDEController?Action=showdoc&DocId=Customer+Drawing%7F1825255%7FA4%7Fpdf%7FEnglish%7FENG_CD_1825255_A4_baseFilename.pdf%7F1825255-1; Throw Configuration: SPDT; Packaging: Bulk; Package Quantity: 560; Max Voltage Rating (AC): 125V; Mounting Technology: TH; RoHS Compliant: True; Case/Package: 1825255-1; Datasheet Version: Rev. A4, 03/2014; Contact Finish: Silver; Package Reference: 1825255-1; Package Description: 5-Pin Through Hole Device, Body 6.7 x 16 mm, Pitch 4 mm; Min Operating Temperature: -20°C; Max Operating Temperature: 85°C
footprint TECO-1825255-1_V (THD, 5-Leads, Body 6.7x16mm, Pitch 4mm)
pins: 1, 2, 3, MH1, MH2

## CMP-00011-2
designator D?, comment DIODE GEN PURP 1KV 1A DO41
Rectifier Diode Switching 1KV 1A 2000ns 2-Pin DO-41 T/R; Capacitance: 15pF; Polarity: Standard; Max Reverse Current: 5uA; Forward Voltage: 1V; Reverse Recovery Time: 2us; Max Surge Current: 30A; Element Configuration: Single; Package Quantity: 1; Max Operating Temperature: 150°C; Number of Pins: 2; Output Current: 1A; Current Rating: 1A; Recovery Time: 2000ns; Packaging: Tape and Reel; Mount: Through Hole; Diameter: 2.7mm; Forward Current: 1A; Length: 5.2mm; Voltage Rating (DC): 1kV; Max Repetitive Reverse Voltage (Vrrm): 1kV; Case/Package: DO-41; Average Rectified Current: 1A; Min Operating Temperature: -55°C; Radiation Hardening: No; RoHS Compliant: Yes; Lead Free: Lead Free; Max Reverse Voltage (DC): 1kV; Reverse Voltage: 1kV; Max Forward Surge Current (Ifsm): 30A; Peak Non-Repetitive Surge Current: 30A
footprint FAIR-DO-41-2-1 (THD, 2-Leads, Body 5.2x2.72mm, Pin Spacing 7.8mm)
pins: 1 K, 2 A

## CMP-011-000002-1
designator L?, comment IND 10mH 1.2 OHM TH
Power Line 10mH @ 1kHz 1.2Ω Through Hole Common Mode Chokes / Filters RoHS; Manufacturer Part Number 1: UU9.8Y-10mH; Manufacturer 1: FH(Guangdong Fenghua Advanced Tech); eVendor: LCSC; eVendor#: C75192; Part#: UU9.8Y-10mH; Source: mits.SchLib; Supplier Unit Price 1: 0.1941; Design Item ID: IND 10mH 1.2 OHM TH
footprint IND 7X8
footprint IND 7X8
pins: 1, 2, 3, 4

## CMP-011-00002-2
designator SW?, comment TS-1109
Tactile Switch, SPST, 12 V, 50 mA, -20 to 80 degC, 4-Pin THD; Manufacturer: Shenzhen Best; RoHS Compliant: Unknown; Manufacturer URL: www.best-dz.com/; Case/Package: TS-1109; Package Reference: TS-1109; Datasheet Version: Dec-12; Mounting Technology: TH; Package Description: 4-Pin Through Hole Device, Body 6.2 x 6.2 mm; Datasheet URL: http://datasheet.octopart.com/TS-1109-Best-Inc.-datasheet-30458100.pdf
footprint BEST-TS-1109_V (THD, 4-Leads, Body 6.2x6.2mm)
pins: 1, 2, 3, 4

## CMP-011-000003-2
designator L?, comment SRR1280-181K  Min Operating Temperature: -40°C  Case/Package: Nonstandard  Inductance Tolerance: 10%  Manufacturer: Bourns Inc.  Inductance: 180uH  Package Quantity: 400  Resistance: 300MR  RoHS Compliant: Yes  Shielding: Shielded  Max Operating Temperature: 125°C  Current Rating: 1.75A  Packaging: Tape and Reel  Saturation Current: 1.88A  Self Resonant Frequency: 4MHz  Q Factor: 24  Core Material: Ferrite
Inductor Power Shielded Wirewound 180uH 10% 1KHz 24Q-Factor Ferrite 1.75A 0.3Ohm DCR T/R; MSRP: 0,6626; Material: Steel; eVendor: Digi-Key; Sample Rate (Hz): 100kHz; Test Frequency: 796kHz; eVendorPrice: 0,93; eVendor#: SRR1280-181KCT-ND; Datasheet: http://www.bourns.com/data/global/pdfs/SRR1280.pdf; Height: 7.5mm; Frequency: 4MHz; Depth: 12.8mm; Max DC Current: 1.75A; Termination: SMD/SMT; Series: SRR1280; Design Item ID: IND 180uH 1.75A SMD; RMS Current (Irms): 1.75A; MOQ: 100; DC Resistance (DCR): 300mR; Part#: SRR1280-181K; Resistor Type: Wirewound; Military Standard: Not; Source: mits.SchLib; Number of Pins: 2; REACH SVHC: No SVHC; DC Current: 1.75A; Tolerance: 10%; Height - Seated (Max): 0.315inch; Width: 12.5mm; Mount: Surface Mount; Length: 12.5mm
footprint INDUCTOR_1210
pins: 1, 2

## CMP-011-00003-2
designator SW?, comment 1825289-1
Slide Switch, DPDT, 0.3A, 125 V, -20 to 85 degC, 6-Pin THD, RoHS, Bulk; Manufacturer: TE Connectivity; Max Contact Resistance: 30mohm; Operating Force: 600gf; Voltage Rating (AC): 125V; Max Current Rating: 300mA; Throw Configuration: DPDT; Mounting Technology: TH; Manufacturer URL: http://www.te.com/; Contact Plating: Silver; Datasheet Version: Mar-08; Max Operating Temperature: 85°C; Contact Finish: Silver; Package Reference: 1825289-1; Package Quantity: 560; Min Operating Temperature: -20°C; Max Voltage Rating (AC): 125V; RoHS Compliant: True; Package Description: 6-Pin Through Hole Device, Body 16 x 6.7 mm, Height 12.05 mm; Current Rating: 300mA; Packaging: Bulk; Case/Package: 1825289-1; Contact Material: Copper; Package URL: http://www.te.com/commerce/DocumentDelivery/DDEController?Action=showdoc&DocId=Customer+Drawing%7F1825289%7FB3%7Fpdf%7FEnglish%7FENG_CD_1825289_B3.pdf%7F1825289-1; Datasheet URL: http://www.te.com/commerce/DocumentDelivery/DDEController?Action=showdoc&DocId=Catalog+Section%7F1308111-1_SWITCHES_CORE_PROGRAM_CATALOG%7F0308%7Fpdf%7FEnglish%7FENG_CS_1308111-1_SWITCHES_CORE_PROGRAM_CATALOG_0308.pdf%7F1825289-1
footprint TE-1825289-1_V (TH, 6-Leads, Body 16.05x6.75mm)
pins: 1, 2, 3, 4, 5, 6, MH1, MH2

## CMP-011-000004-1
designator L?, comment IND 7.6UH 6A 19 MOHM SMD  Packaging: Cut Tape (CT)  Shielding: Shielded  Inductance: 7.6µH  Tolerance: ±30%  Current Rating: 6A  Manufacturer: Bourns Inc.
FIXED IND 7.6UH 6A 19 MOHM SMD; Manufacturer Part Number: SRR1260-7R6Y; Type: Wirewound; Q @ Freq: 16 @ 7.96MHz; Material - Core: Ferrite; Frequency - Self Resonant: 27.9MHz; Current - Saturation: 6.2A; Frequency - Test: 100kHz; DC Resistance (DCR): 19 mOhm Max; Source: mits.SchLib; Part Status: Active; Category: Inductors, Coils, Chokes; Ratings: -; RoHS: RoHS Compliant; Size / Dimension: 0.492" L x 0.492" W (12.50mm x 12.50mm); ComponentLink1Description: http://www.bourns.com/docs/Product-Datasheets/SRR1260.pdf; Operating Temperature: -40°C ~ 125°C; ComponentLink1URL: http://www.bourns.com/docs/Product-Datasheets/SRR1260.pdf; Stock 1: 764; Pricing 1: 1=0.99, 10=0.93, 25=0.868, 50=0.744, 100=0.7068, 250=0.6448 (USD); Design Item ID: IND 7.6UH 6A 19 MOHM SMD; Package / Case: Nonstandard; Mounting Type: Surface Mount; Height - Seated (Max): 0.256" (6.50mm)
footprint INDUCTOR_12.5mmx12.5mm
pins: 1, 2